# Altium footprint library con-samtec.PCBLIB: 805 footprints (part 30 of 55)
Each footprint in its own frame and in the unit in brackets; x right, y up, seen from the top. Pads: shape width x height; smd on the part's side, far side on the other; paste and mask are expansions set on the pad; w line width, h text height; cw(c..) or ccw(c..) is an arc to the next point about the centre after c.
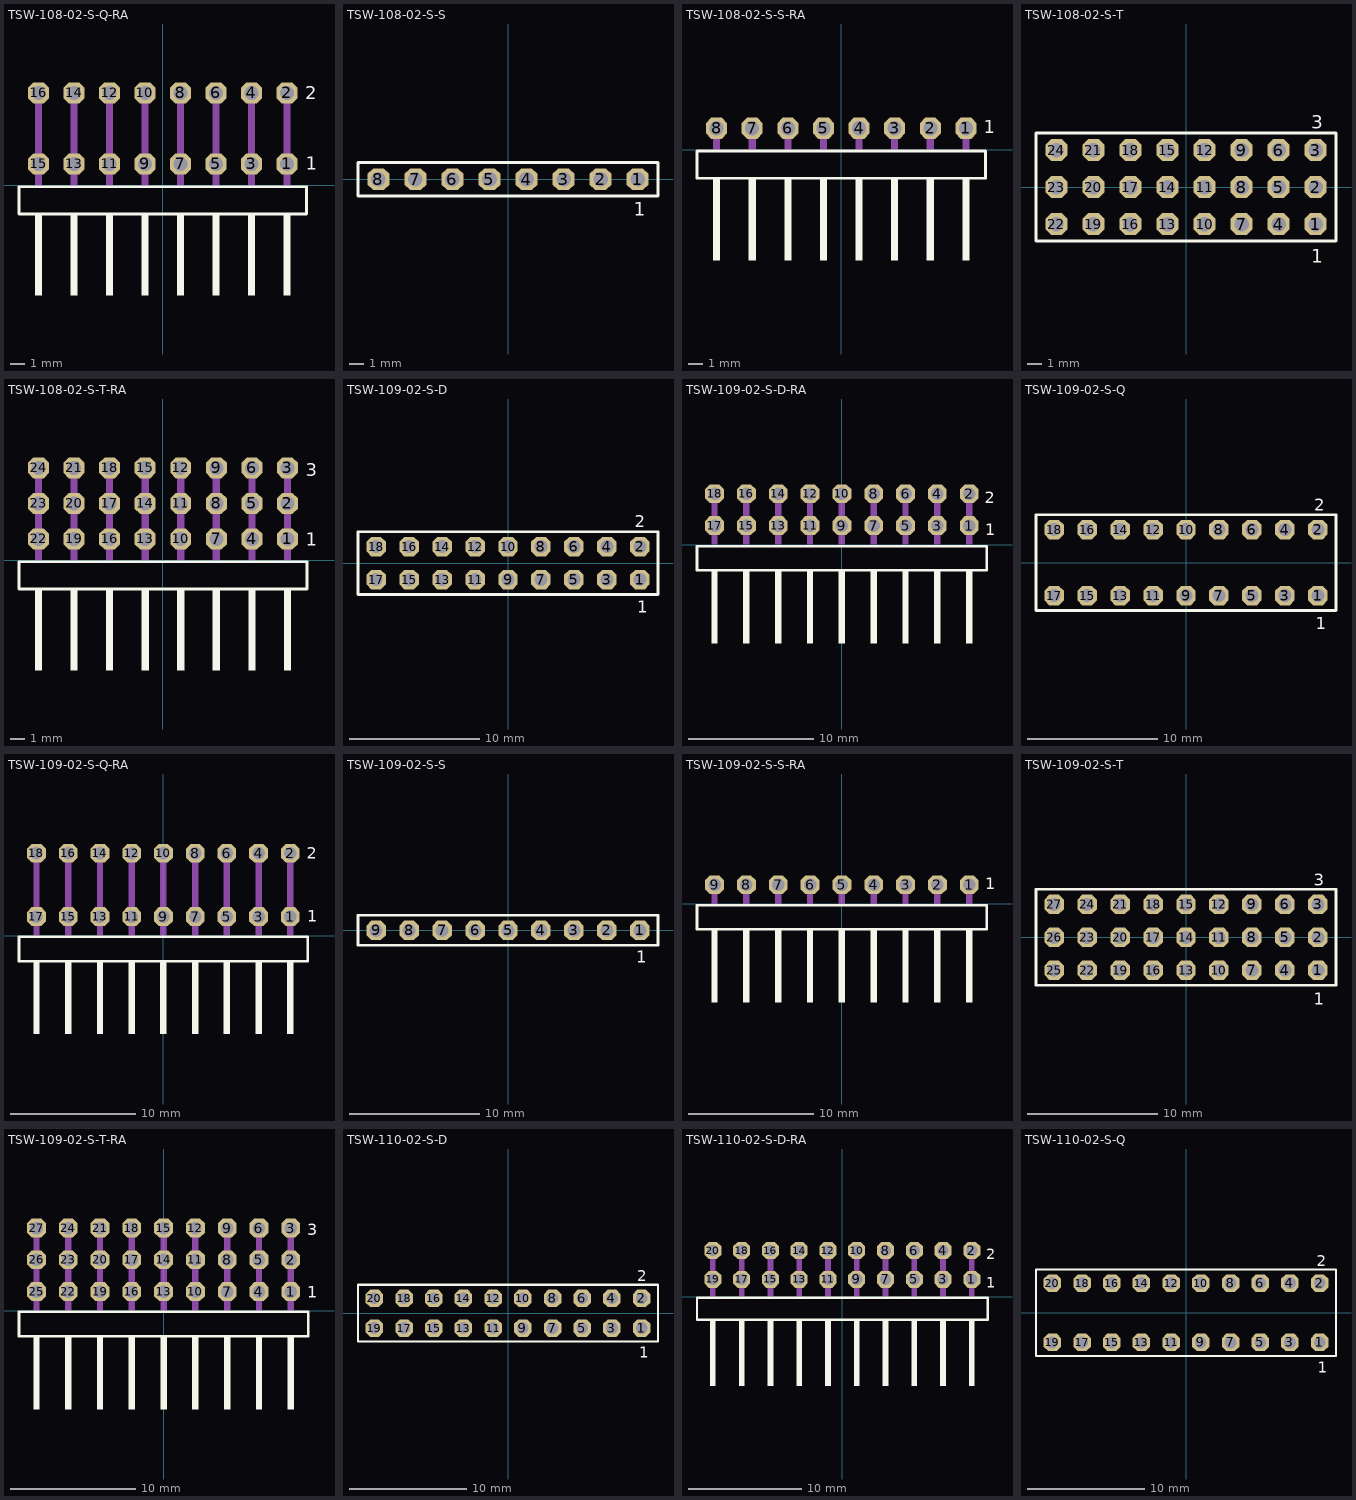
[diagram p29: the footprints below, top view; thin cyan lines are the x and y axes]

## TSW-108-02-S-Q-RA [mil]
pads (16):
  oct 59.06x59.06 hole 39.37: 1(350,60) 2(350,260) 3(250,60) 4(250,260) 5(150,60) 6(150,260) 7(50,60) 8(50,260) 9(-50,60) 10(-50,260) 11(-150,60) 12(-150,260) 13(-250,60) 14(-250,260) 15(-350,60) 16(-350,260)
Top Overlay:
  rectangle: -360,-310.63 -340,-80.32
  rectangle: -260,-310.63 -240,-80.32
  rectangle: -160,-310.63 -140,-80.32
  rectangle: -60,-310.63 -40,-80.32
  rectangle: 40,-310.63 60,-80.32
  rectangle: 140,-310.63 160,-80.32
  rectangle: 240,-310.63 260,-80.32
  rectangle: 340,-310.63 360,-80.32
  lines w8: -405.08,-80.55 405.08,-80.55 405.08,-4.17 -405.08,-4.17 -405.08,-80.55
  text "1" at 403.54,43.31 h36.81
  text "2" at 401.18,242.72 h36.81
Mechanical 16:
  rectangle: -360,0 -340,270
  rectangle: -260,0 -240,270
  rectangle: -160,0 -140,270
  rectangle: -60,0 -40,270
  rectangle: 40,0 60,270
  rectangle: 140,0 160,270
  rectangle: 240,0 260,270
  rectangle: 340,0 360,270

## TSW-108-02-S-S [mm]
pads (8):
  oct 1.5x1.5 hole 1: 1(8.89,0) 2(6.35,0) 3(3.81,0) 4(1.27,0) 5(-1.27,0) 6(-3.81,0) 7(-6.35,0) 8(-8.89,0)
Top Overlay:
  lines w0.203: -10.289,-1.155 10.289,-1.155 10.289,1.155 -10.289,1.155 -10.289,-1.155
  text "1" at 8.632,-2.498 h0.94
Mechanical 16:
  rectangle: -9.24,-0.35 -8.54,0.35
  rectangle: -6.7,-0.35 -6,0.35
  rectangle: -4.16,-0.35 -3.46,0.35
  rectangle: -1.62,-0.35 -0.92,0.35
  rectangle: 0.92,-0.35 1.62,0.35
  rectangle: 3.46,-0.35 4.16,0.35
  rectangle: 6,-0.35 6.7,0.35
  rectangle: 8.54,-0.35 9.24,0.35

## TSW-108-02-S-S-RA [mil]
pads (8):
  oct 59.06x59.06 hole 39.37: 1(350,60) 2(250,60) 3(150,60) 4(50,60) 5(-50,60) 6(-150,60) 7(-250,60) 8(-350,60)
Top Overlay:
  rectangle: -360,-310.63 -340,-80.32
  rectangle: -260,-310.63 -240,-80.32
  rectangle: -160,-310.63 -140,-80.32
  rectangle: -60,-310.63 -40,-80.32
  rectangle: 40,-310.63 60,-80.32
  rectangle: 140,-310.63 160,-80.32
  rectangle: 240,-310.63 260,-80.32
  rectangle: 340,-310.63 360,-80.32
  lines w8: -405.08,-80.55 405.08,-80.55 405.08,-4.17 -405.08,-4.17 -405.08,-80.55
  text "1" at 400.47,45.35 h36.81
Mechanical 16:
  rectangle: -360,0 -340,70
  rectangle: -260,0 -240,70
  rectangle: -160,0 -140,70
  rectangle: -60,0 -40,70
  rectangle: 40,0 60,70
  rectangle: 140,0 160,70
  rectangle: 240,0 260,70
  rectangle: 340,0 360,70

## TSW-108-02-S-T [mm]
pads (24):
  oct 1.5x1.5 hole 1: 1(8.89,-2.54) 2(8.89,0) 3(8.89,2.54) 4(6.35,-2.54) 5(6.35,0) 6(6.35,2.54) 7(3.81,-2.54) 8(3.81,0) 9(3.81,2.54) 10(1.27,-2.54) 11(1.27,0) 12(1.27,2.54) 13(-1.27,-2.54) 14(-1.27,0) 15(-1.27,2.54) 16(-3.81,-2.54) 17(-3.81,0) 18(-3.81,2.54) 19(-6.35,-2.54) 20(-6.35,0) 21(-6.35,2.54) 22(-8.89,-2.54) 23(-8.89,0) 24(-8.89,2.54)
Top Overlay:
  lines w0.203: -10.289,-3.695 10.289,-3.695 10.289,3.695 -10.289,3.695 -10.289,-3.695
  text "1" at 8.582,-5.188 h0.94
  text "3" at 8.578,3.989 h0.94
Mechanical 16:
  rectangle: -9.24,-2.89 -8.54,-2.19
  rectangle: -9.24,-0.35 -8.54,0.35
  rectangle: -9.24,2.19 -8.54,2.89
  rectangle: -6.7,-2.89 -6,-2.19
  rectangle: -6.7,-0.35 -6,0.35
  rectangle: -6.7,2.19 -6,2.89
  rectangle: -4.16,-2.89 -3.46,-2.19
  rectangle: -4.16,-0.35 -3.46,0.35
  rectangle: -4.16,2.19 -3.46,2.89
  rectangle: -1.62,-2.89 -0.92,-2.19
  rectangle: -1.62,-0.35 -0.92,0.35
  rectangle: -1.62,2.19 -0.92,2.89
  rectangle: 0.92,-2.89 1.62,-2.19
  rectangle: 0.92,-0.35 1.62,0.35
  rectangle: 0.92,2.19 1.62,2.89
  rectangle: 3.46,-2.89 4.16,-2.19
  rectangle: 3.46,-0.35 4.16,0.35
  rectangle: 3.46,2.19 4.16,2.89
  rectangle: 6,-2.89 6.7,-2.19
  rectangle: 6,-0.35 6.7,0.35
  rectangle: 6,2.19 6.7,2.89
  rectangle: 8.54,-2.89 9.24,-2.19
  rectangle: 8.54,-0.35 9.24,0.35
  rectangle: 8.54,2.19 9.24,2.89

## TSW-108-02-S-T-RA [mil]
pads (24):
  oct 59.06x59.06 hole 39.37: 1(350,60) 2(350,160) 3(350,260) 4(250,60) 5(250,160) 6(250,260) 7(150,60) 8(150,160) 9(150,260) 10(50,60) 11(50,160) 12(50,260) 13(-50,60) 14(-50,160) 15(-50,260) 16(-150,60) 17(-150,160) 18(-150,260) 19(-250,60) 20(-250,160) 21(-250,260) 22(-350,60) 23(-350,160) 24(-350,260)
Top Overlay:
  rectangle: -360,-310.63 -340,-80.32
  rectangle: -260,-310.63 -240,-80.32
  rectangle: -160,-310.63 -140,-80.32
  rectangle: -60,-310.63 -40,-80.32
  rectangle: 40,-310.63 60,-80.32
  rectangle: 140,-310.63 160,-80.32
  rectangle: 240,-310.63 260,-80.32
  rectangle: 340,-310.63 360,-80.32
  lines w8: -405.08,-80.55 405.08,-80.55 405.08,-4.17 -405.08,-4.17 -405.08,-80.55
  text "1" at 401.57,41.34 h36.81
  text "3" at 402.17,236.81 h36.81
Mechanical 16:
  rectangle: -360,0 -340,270
  rectangle: -260,0 -240,270
  rectangle: -160,0 -140,270
  rectangle: -60,0 -40,270
  rectangle: 40,0 60,270
  rectangle: 140,0 160,270
  rectangle: 240,0 260,270
  rectangle: 340,0 360,270

## TSW-109-02-S-D [mm]
pads (18):
  oct 1.5x1.5 hole 1: 1(10.16,-1.27) 2(10.16,1.27) 3(7.62,-1.27) 4(7.62,1.27) 5(5.08,-1.27) 6(5.08,1.27) 7(2.54,-1.27) 8(2.54,1.27) 9(0,-1.27) 10(0,1.27) 11(-2.54,-1.27) 12(-2.54,1.27) 13(-5.08,-1.27) 14(-5.08,1.27) 15(-7.62,-1.27) 16(-7.62,1.27) 17(-10.16,-1.27) 18(-10.16,1.27)
Top Overlay:
  lines w0.203: -11.559,-2.425 11.559,-2.425 11.559,2.425 -11.559,2.425 -11.559,-2.425
  text "1" at 9.952,-3.818 h0.94
  text "2" at 9.777,2.744 h0.94
Mechanical 16:
  rectangle: -10.51,-1.62 -9.81,-0.92
  rectangle: -10.51,0.92 -9.81,1.62
  rectangle: -7.97,-1.62 -7.27,-0.92
  rectangle: -7.97,0.92 -7.27,1.62
  rectangle: -5.43,-1.62 -4.73,-0.92
  rectangle: -5.43,0.92 -4.73,1.62
  rectangle: -2.89,-1.62 -2.19,-0.92
  rectangle: -2.89,0.92 -2.19,1.62
  rectangle: -0.35,-1.62 0.35,-0.92
  rectangle: -0.35,0.92 0.35,1.62
  rectangle: 2.19,-1.62 2.89,-0.92
  rectangle: 2.19,0.92 2.89,1.62
  rectangle: 4.73,-1.62 5.43,-0.92
  rectangle: 4.73,0.92 5.43,1.62
  rectangle: 7.27,-1.62 7.97,-0.92
  rectangle: 7.27,0.92 7.97,1.62
  rectangle: 9.81,-1.62 10.51,-0.92
  rectangle: 9.81,0.92 10.51,1.62

## TSW-109-02-S-D-RA [mil]
pads (18):
  oct 59.06x59.06 hole 39.37: 1(400,60) 2(400,160) 3(300,60) 4(300,160) 5(200,60) 6(200,160) 7(100,60) 8(100,160) 9(0,60) 10(0,160) 11(-100,60) 12(-100,160) 13(-200,60) 14(-200,160) 15(-300,60) 16(-300,160) 17(-400,60) 18(-400,160)
Top Overlay:
  rectangle: -410,-310.63 -390,-80.32
  rectangle: -310,-310.63 -290,-80.32
  rectangle: -210,-310.63 -190,-80.32
  rectangle: -110,-310.63 -90,-80.32
  rectangle: -10,-310.63 10,-80.32
  rectangle: 90,-310.63 110,-80.32
  rectangle: 190,-310.63 210,-80.32
  rectangle: 290,-310.63 310,-80.32
  rectangle: 390,-310.63 410,-80.32
  lines w8: -455.08,-80.55 455.08,-80.55 455.08,-4.17 -455.08,-4.17 -455.08,-80.55
  text "1" at 450.59,30.51 h36.81
  text "2" at 449.21,129.53 h36.81
Mechanical 16:
  rectangle: -410,0 -390,170
  rectangle: -310,0 -290,170
  rectangle: -210,0 -190,170
  rectangle: -110,0 -90,170
  rectangle: -10,0 10,170
  rectangle: 90,0 110,170
  rectangle: 190,0 210,170
  rectangle: 290,0 310,170
  rectangle: 390,0 410,170

## TSW-109-02-S-Q [mm]
pads (18):
  oct 1.5x1.5 hole 1: 1(10.16,-2.54) 2(10.16,2.54) 3(7.62,-2.54) 4(7.62,2.54) 5(5.08,-2.54) 6(5.08,2.54) 7(2.54,-2.54) 8(2.54,2.54) 9(0,-2.54) 10(0,2.54) 11(-2.54,-2.54) 12(-2.54,2.54) 13(-5.08,-2.54) 14(-5.08,2.54) 15(-7.62,-2.54) 16(-7.62,2.54) 17(-10.16,-2.54) 18(-10.16,2.54)
Top Overlay:
  lines w0.203: -11.559,-3.695 11.559,-3.695 11.559,3.695 -11.559,3.695 -11.559,-3.695
  text "1" at 10.002,-5.138 h0.94
  text "2" at 9.902,3.989 h0.94
Mechanical 16:
  rectangle: -10.51,-2.89 -9.81,-2.19
  rectangle: -10.51,2.19 -9.81,2.89
  rectangle: -7.97,-2.89 -7.27,-2.19
  rectangle: -7.97,2.19 -7.27,2.89
  rectangle: -5.43,-2.89 -4.73,-2.19
  rectangle: -5.43,2.19 -4.73,2.89
  rectangle: -2.89,-2.89 -2.19,-2.19
  rectangle: -2.89,2.19 -2.19,2.89
  rectangle: -0.35,-2.89 0.35,-2.19
  rectangle: -0.35,2.19 0.35,2.89
  rectangle: 2.19,-2.89 2.89,-2.19
  rectangle: 2.19,2.19 2.89,2.89
  rectangle: 4.73,-2.89 5.43,-2.19
  rectangle: 4.73,2.19 5.43,2.89
  rectangle: 7.27,-2.89 7.97,-2.19
  rectangle: 7.27,2.19 7.97,2.89
  rectangle: 9.81,-2.89 10.51,-2.19
  rectangle: 9.81,2.19 10.51,2.89

## TSW-109-02-S-Q-RA [mil]
pads (18):
  oct 59.06x59.06 hole 39.37: 1(400,60) 2(400,260) 3(300,60) 4(300,260) 5(200,60) 6(200,260) 7(100,60) 8(100,260) 9(0,60) 10(0,260) 11(-100,60) 12(-100,260) 13(-200,60) 14(-200,260) 15(-300,60) 16(-300,260) 17(-400,60) 18(-400,260)
Top Overlay:
  rectangle: -410,-310.63 -390,-80.32
  rectangle: -310,-310.63 -290,-80.32
  rectangle: -210,-310.63 -190,-80.32
  rectangle: -110,-310.63 -90,-80.32
  rectangle: -10,-310.63 10,-80.32
  rectangle: 90,-310.63 110,-80.32
  rectangle: 190,-310.63 210,-80.32
  rectangle: 290,-310.63 310,-80.32
  rectangle: 390,-310.63 410,-80.32
  lines w8: -455.08,-80.55 455.08,-80.55 455.08,-4.17 -455.08,-4.17 -455.08,-80.55
  text "1" at 453.54,43.31 h36.81
  text "2" at 451.18,242.72 h36.81
Mechanical 16:
  rectangle: -410,0 -390,270
  rectangle: -310,0 -290,270
  rectangle: -210,0 -190,270
  rectangle: -110,0 -90,270
  rectangle: -10,0 10,270
  rectangle: 90,0 110,270
  rectangle: 190,0 210,270
  rectangle: 290,0 310,270
  rectangle: 390,0 410,270

## TSW-109-02-S-S [mm]
pads (9):
  oct 1.5x1.5 hole 1: 1(10.16,0) 2(7.62,0) 3(5.08,0) 4(2.54,0) 5(0,0) 6(-2.54,0) 7(-5.08,0) 8(-7.62,0) 9(-10.16,0)
Top Overlay:
  lines w0.203: -11.559,-1.155 11.559,-1.155 11.559,1.155 -11.559,1.155 -11.559,-1.155
  text "1" at 9.902,-2.498 h0.94
Mechanical 16:
  rectangle: -10.51,-0.35 -9.81,0.35
  rectangle: -7.97,-0.35 -7.27,0.35
  rectangle: -5.43,-0.35 -4.73,0.35
  rectangle: -2.89,-0.35 -2.19,0.35
  rectangle: -0.35,-0.35 0.35,0.35
  rectangle: 2.19,-0.35 2.89,0.35
  rectangle: 4.73,-0.35 5.43,0.35
  rectangle: 7.27,-0.35 7.97,0.35
  rectangle: 9.81,-0.35 10.51,0.35

## TSW-109-02-S-S-RA [mil]
pads (9):
  oct 59.06x59.06 hole 39.37: 1(400,60) 2(300,60) 3(200,60) 4(100,60) 5(0,60) 6(-100,60) 7(-200,60) 8(-300,60) 9(-400,60)
Top Overlay:
  rectangle: -410,-310.63 -390,-80.32
  rectangle: -310,-310.63 -290,-80.32
  rectangle: -210,-310.63 -190,-80.32
  rectangle: -110,-310.63 -90,-80.32
  rectangle: -10,-310.63 10,-80.32
  rectangle: 90,-310.63 110,-80.32
  rectangle: 190,-310.63 210,-80.32
  rectangle: 290,-310.63 310,-80.32
  rectangle: 390,-310.63 410,-80.32
  lines w8: -455.08,-80.55 455.08,-80.55 455.08,-4.17 -455.08,-4.17 -455.08,-80.55
  text "1" at 450.47,45.35 h36.81
Mechanical 16:
  rectangle: -410,0 -390,70
  rectangle: -310,0 -290,70
  rectangle: -210,0 -190,70
  rectangle: -110,0 -90,70
  rectangle: -10,0 10,70
  rectangle: 90,0 110,70
  rectangle: 190,0 210,70
  rectangle: 290,0 310,70
  rectangle: 390,0 410,70

## TSW-109-02-S-T [mm]
pads (27):
  oct 1.5x1.5 hole 1: 1(10.16,-2.54) 2(10.16,0) 3(10.16,2.54) 4(7.62,-2.54) 5(7.62,0) 6(7.62,2.54) 7(5.08,-2.54) 8(5.08,0) 9(5.08,2.54) 10(2.54,-2.54) 11(2.54,0) 12(2.54,2.54) 13(0,-2.54) 14(0,0) 15(0,2.54) 16(-2.54,-2.54) 17(-2.54,0) 18(-2.54,2.54) 19(-5.08,-2.54) 20(-5.08,0) 21(-5.08,2.54) 22(-7.62,-2.54) 23(-7.62,0) 24(-7.62,2.54) 25(-10.16,-2.54) 26(-10.16,0) 27(-10.16,2.54)
Top Overlay:
  lines w0.203: -11.559,-3.695 11.559,-3.695 11.559,3.695 -11.559,3.695 -11.559,-3.695
  text "1" at 9.852,-5.188 h0.94
  text "3" at 9.848,3.989 h0.94
Mechanical 16:
  rectangle: -10.51,-2.89 -9.81,-2.19
  rectangle: -10.51,-0.35 -9.81,0.35
  rectangle: -10.51,2.19 -9.81,2.89
  rectangle: -7.97,-2.89 -7.27,-2.19
  rectangle: -7.97,-0.35 -7.27,0.35
  rectangle: -7.97,2.19 -7.27,2.89
  rectangle: -5.43,-2.89 -4.73,-2.19
  rectangle: -5.43,-0.35 -4.73,0.35
  rectangle: -5.43,2.19 -4.73,2.89
  rectangle: -2.89,-2.89 -2.19,-2.19
  rectangle: -2.89,-0.35 -2.19,0.35
  rectangle: -2.89,2.19 -2.19,2.89
  rectangle: -0.35,-2.89 0.35,-2.19
  rectangle: -0.35,-0.35 0.35,0.35
  rectangle: -0.35,2.19 0.35,2.89
  rectangle: 2.19,-2.89 2.89,-2.19
  rectangle: 2.19,-0.35 2.89,0.35
  rectangle: 2.19,2.19 2.89,2.89
  rectangle: 4.73,-2.89 5.43,-2.19
  rectangle: 4.73,-0.35 5.43,0.35
  rectangle: 4.73,2.19 5.43,2.89
  rectangle: 7.27,-2.89 7.97,-2.19
  rectangle: 7.27,-0.35 7.97,0.35
  rectangle: 7.27,2.19 7.97,2.89
  rectangle: 9.81,-2.89 10.51,-2.19
  rectangle: 9.81,-0.35 10.51,0.35
  rectangle: 9.81,2.19 10.51,2.89

## TSW-109-02-S-T-RA [mil]
pads (27):
  oct 59.06x59.06 hole 39.37: 1(400,60) 2(400,160) 3(400,260) 4(300,60) 5(300,160) 6(300,260) 7(200,60) 8(200,160) 9(200,260) 10(100,60) 11(100,160) 12(100,260) 13(0,60) 14(0,160) 15(0,260) 16(-100,60) 17(-100,160) 18(-100,260) 19(-200,60) 20(-200,160) 21(-200,260) 22(-300,60) 23(-300,160) 24(-300,260) 25(-400,60) 26(-400,160) 27(-400,260)
Top Overlay:
  rectangle: -410,-310.63 -390,-80.32
  rectangle: -310,-310.63 -290,-80.32
  rectangle: -210,-310.63 -190,-80.32
  rectangle: -110,-310.63 -90,-80.32
  rectangle: -10,-310.63 10,-80.32
  rectangle: 90,-310.63 110,-80.32
  rectangle: 190,-310.63 210,-80.32
  rectangle: 290,-310.63 310,-80.32
  rectangle: 390,-310.63 410,-80.32
  lines w8: -455.08,-80.55 455.08,-80.55 455.08,-4.17 -455.08,-4.17 -455.08,-80.55
  text "1" at 451.57,41.34 h36.81
  text "3" at 452.17,236.81 h36.81
Mechanical 16:
  rectangle: -410,0 -390,270
  rectangle: -310,0 -290,270
  rectangle: -210,0 -190,270
  rectangle: -110,0 -90,270
  rectangle: -10,0 10,270
  rectangle: 90,0 110,270
  rectangle: 190,0 210,270
  rectangle: 290,0 310,270
  rectangle: 390,0 410,270

## TSW-110-02-S-D [mm]
pads (20):
  oct 1.5x1.5 hole 1: 1(11.43,-1.27) 2(11.43,1.27) 3(8.89,-1.27) 4(8.89,1.27) 5(6.35,-1.27) 6(6.35,1.27) 7(3.81,-1.27) 8(3.81,1.27) 9(1.27,-1.27) 10(1.27,1.27) 11(-1.27,-1.27) 12(-1.27,1.27) 13(-3.81,-1.27) 14(-3.81,1.27) 15(-6.35,-1.27) 16(-6.35,1.27) 17(-8.89,-1.27) 18(-8.89,1.27) 19(-11.43,-1.27) 20(-11.43,1.27)
Top Overlay:
  lines w0.203: -12.829,-2.425 12.829,-2.425 12.829,2.425 -12.829,2.425 -12.829,-2.425
  text "1" at 11.222,-3.818 h0.94
  text "2" at 11.047,2.744 h0.94
Mechanical 16:
  rectangle: -11.78,-1.62 -11.08,-0.92
  rectangle: -11.78,0.92 -11.08,1.62
  rectangle: -9.24,-1.62 -8.54,-0.92
  rectangle: -9.24,0.92 -8.54,1.62
  rectangle: -6.7,-1.62 -6,-0.92
  rectangle: -6.7,0.92 -6,1.62
  rectangle: -4.16,-1.62 -3.46,-0.92
  rectangle: -4.16,0.92 -3.46,1.62
  rectangle: -1.62,-1.62 -0.92,-0.92
  rectangle: -1.62,0.92 -0.92,1.62
  rectangle: 0.92,-1.62 1.62,-0.92
  rectangle: 0.92,0.92 1.62,1.62
  rectangle: 3.46,-1.62 4.16,-0.92
  rectangle: 3.46,0.92 4.16,1.62
  rectangle: 6,-1.62 6.7,-0.92
  rectangle: 6,0.92 6.7,1.62
  rectangle: 8.54,-1.62 9.24,-0.92
  rectangle: 8.54,0.92 9.24,1.62
  rectangle: 11.08,-1.62 11.78,-0.92
  rectangle: 11.08,0.92 11.78,1.62

## TSW-110-02-S-D-RA [mil]
pads (20):
  oct 59.06x59.06 hole 39.37: 1(450,60) 2(450,160) 3(350,60) 4(350,160) 5(250,60) 6(250,160) 7(150,60) 8(150,160) 9(50,60) 10(50,160) 11(-50,60) 12(-50,160) 13(-150,60) 14(-150,160) 15(-250,60) 16(-250,160) 17(-350,60) 18(-350,160) 19(-450,60) 20(-450,160)
Top Overlay:
  rectangle: -460,-310.63 -440,-80.32
  rectangle: -360,-310.63 -340,-80.32
  rectangle: -260,-310.63 -240,-80.32
  rectangle: -160,-310.63 -140,-80.32
  rectangle: -60,-310.63 -40,-80.32
  rectangle: 40,-310.63 60,-80.32
  rectangle: 140,-310.63 160,-80.32
  rectangle: 240,-310.63 260,-80.32
  rectangle: 340,-310.63 360,-80.32
  rectangle: 440,-310.63 460,-80.32
  lines w8: -505.08,-80.55 505.08,-80.55 505.08,-4.17 -505.08,-4.17 -505.08,-80.55
  text "1" at 500.59,30.51 h36.81
  text "2" at 499.21,129.53 h36.81
Mechanical 16:
  rectangle: -460,0 -440,170
  rectangle: -360,0 -340,170
  rectangle: -260,0 -240,170
  rectangle: -160,0 -140,170
  rectangle: -60,0 -40,170
  rectangle: 40,0 60,170
  rectangle: 140,0 160,170
  rectangle: 240,0 260,170
  rectangle: 340,0 360,170
  rectangle: 440,0 460,170

## TSW-110-02-S-Q [mm]
pads (20):
  oct 1.5x1.5 hole 1: 1(11.43,-2.54) 2(11.43,2.54) 3(8.89,-2.54) 4(8.89,2.54) 5(6.35,-2.54) 6(6.35,2.54) 7(3.81,-2.54) 8(3.81,2.54) 9(1.27,-2.54) 10(1.27,2.54) 11(-1.27,-2.54) 12(-1.27,2.54) 13(-3.81,-2.54) 14(-3.81,2.54) 15(-6.35,-2.54) 16(-6.35,2.54) 17(-8.89,-2.54) 18(-8.89,2.54) 19(-11.43,-2.54) 20(-11.43,2.54)
Top Overlay:
  lines w0.203: -12.829,-3.695 12.829,-3.695 12.829,3.695 -12.829,3.695 -12.829,-3.695
  text "1" at 11.272,-5.138 h0.94
  text "2" at 11.172,3.989 h0.94
Mechanical 16:
  rectangle: -11.78,-2.89 -11.08,-2.19
  rectangle: -11.78,2.19 -11.08,2.89
  rectangle: -9.24,-2.89 -8.54,-2.19
  rectangle: -9.24,2.19 -8.54,2.89
  rectangle: -6.7,-2.89 -6,-2.19
  rectangle: -6.7,2.19 -6,2.89
  rectangle: -4.16,-2.89 -3.46,-2.19
  rectangle: -4.16,2.19 -3.46,2.89
  rectangle: -1.62,-2.89 -0.92,-2.19
  rectangle: -1.62,2.19 -0.92,2.89
  rectangle: 0.92,-2.89 1.62,-2.19
  rectangle: 0.92,2.19 1.62,2.89
  rectangle: 3.46,-2.89 4.16,-2.19
  rectangle: 3.46,2.19 4.16,2.89
  rectangle: 6,-2.89 6.7,-2.19
  rectangle: 6,2.19 6.7,2.89
  rectangle: 8.54,-2.89 9.24,-2.19
  rectangle: 8.54,2.19 9.24,2.89
  rectangle: 11.08,-2.89 11.78,-2.19
  rectangle: 11.08,2.19 11.78,2.89